# Altium footprint library PCB封装库.PcbLib: 109 footprints (part 7 of 7)
Each footprint in its own frame and in the unit in brackets; x right, y up, seen from the top. Pads: shape width x height; smd on the part's side, far side on the other; paste and mask are expansions set on the pad; w line width, h text height; cw(c..) or ccw(c..) is an arc to the next point about the centre after c.
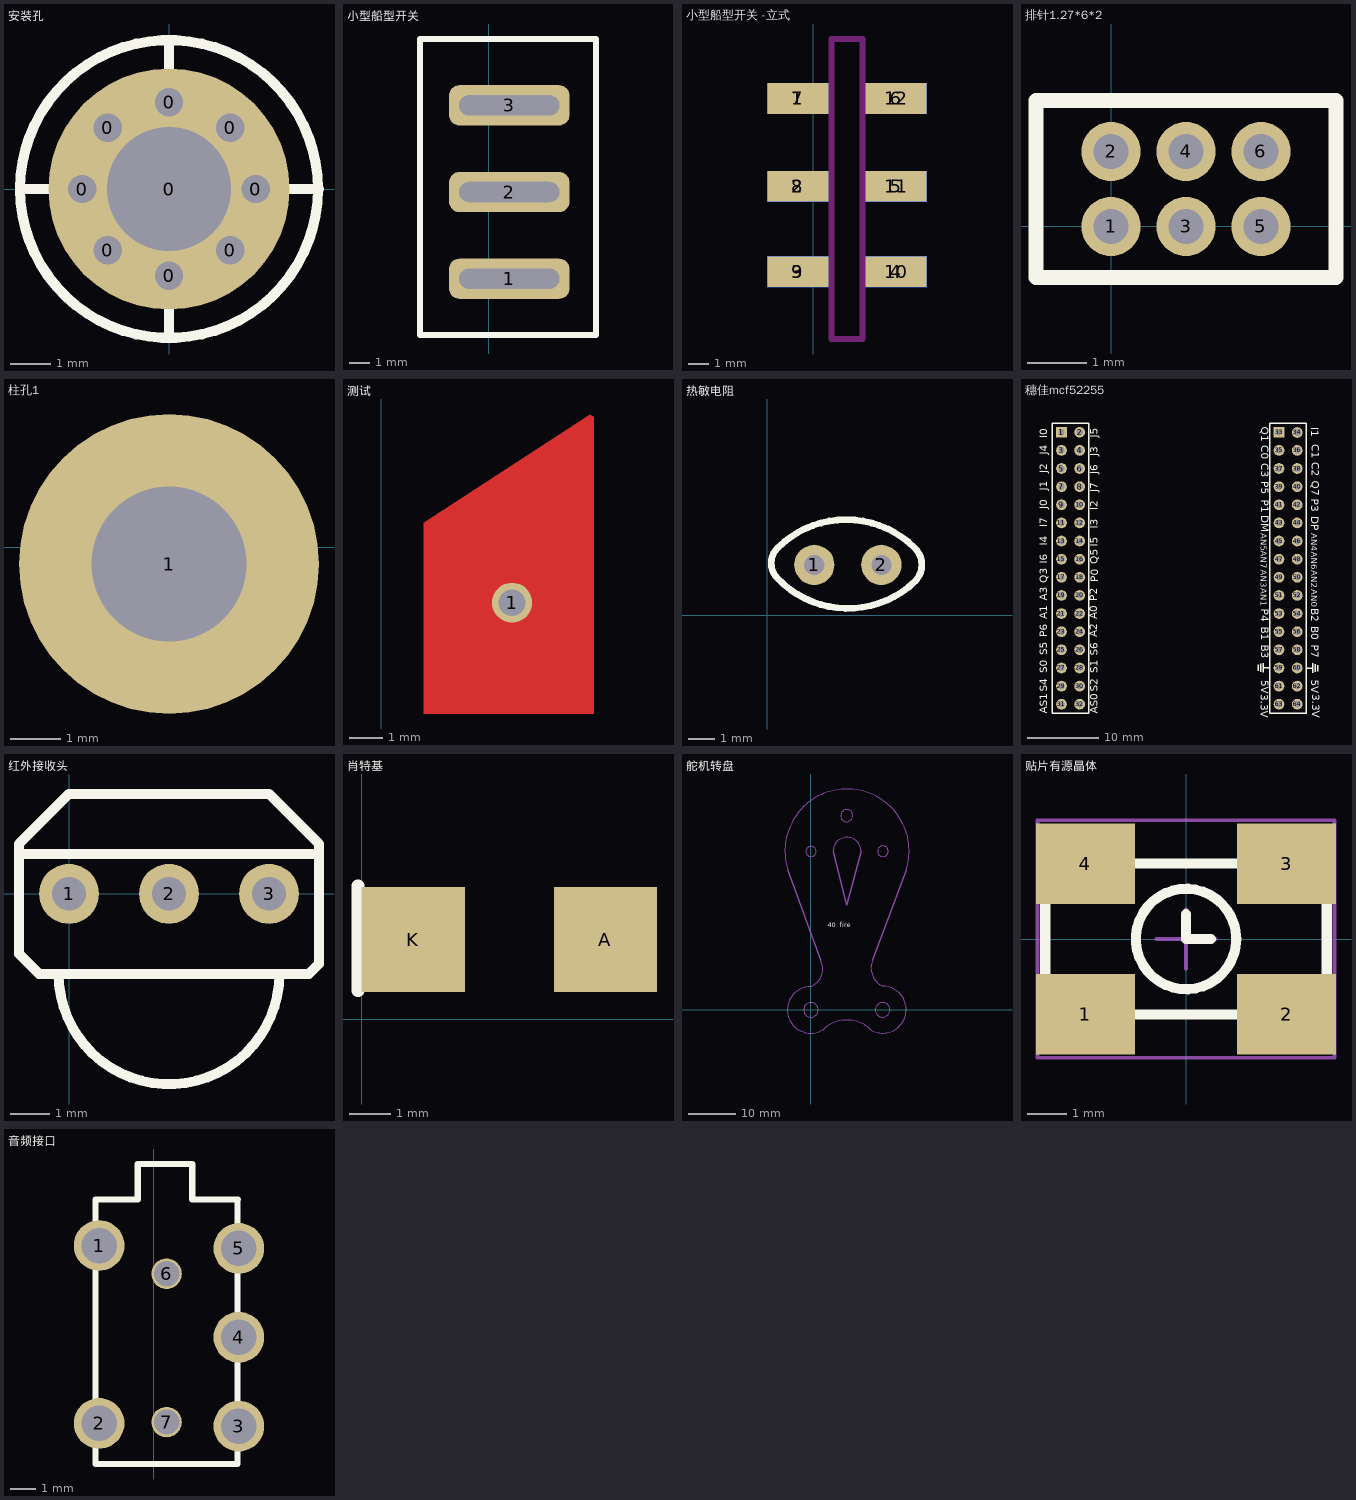
[diagram p6: the footprints below, top view; thin cyan lines are the x and y axes]

## 安装孔 [mm]
pads (9):
  round 1.2 hole 0.7: 0(-2.159,0) 0(-1.524,-1.524) 0(-1.524,1.524) 0(0,-2.159) 0(0,2.159) 0(1.524,-1.524) 0(1.524,1.524) 0(2.159,0)
  round 6 hole 3.1: 0(0,0)
Top Overlay:
  circle w0.254: c0,0 r3.709
  lines w0.254: 3.709,0 0,0 ; 3.735,0 0,0 ; 0,0 0,3.683 0,0 ; 0,0 0,-3.683 0,0 ; 0,0 -3.683,0 0,0
Bottom Overlay:
  circle w0.254: c0,0 r3.735
3D body: height 2.38, standoff -6, extent -2.825,-2.774 2.775,2.826

## 小型船型开关 [mm]
pads (3):
  rrect50% 6x2 hole 1 slot 5 at 0 deg: 1(1.016,4.064) 2(1.016,8.382) 3(1.016,12.7)
Top Overlay:
  lines w0.3: -3.429,1.27 5.334,1.27 5.334,16.002 -3.429,16.002 -3.429,1.27
3D body: height 4.5, standoff -14.51, extent -4.277,0.98 6.223,16.038

## 小型船型开关 -立式 [mm]
pads (12):
  rect 3x1.5 smd: 1(-0.762,12.954) 2(-0.762,8.636) 3(-0.762,4.445) 4(4.064,4.445) 5(4.064,8.636) 6(4.064,12.954)
  rect 3x1.5 smd far side: 7(-0.762,12.954) 8(-0.762,8.636) 9(-0.762,4.445) 10(4.064,4.445) 11(4.064,8.636) 12(4.064,12.954)
Keep-Out Layer:
  lines w0.3: 0.889,1.143 2.413,1.143 2.413,15.875 0.889,15.875 0.889,1.143
3D body: height 4.5, standoff -14.51, extent -4.277,0.98 6.223,16.038

## 排针1.27*6*2 [mm]
pads (6):
  round 1 hole 0.6: 1(0,0) 2(0,1.27) 3(1.27,0) 4(1.27,1.27) 5(2.54,0) 6(2.54,1.27)
Top Overlay:
  lines w0.254: -1.27,-0.864 -1.27,2.134 3.81,2.134 3.81,-0.864 -1.27,-0.864

## 柱孔1 [mm]
pads (1):
  round 6 hole 3.1: 1(6.655,-0.33)
3D body: height 2.38, standoff -6, extent 3.855,-3.13 9.455,2.47

## 测试 [mm]
pads (1):
  round 1.2 hole 0.8: 1(3.912,6.833)
Top Layer:
  region: 6.35,12.389 6.35,9.22 6.35,3.505 1.27,3.505 1.27,9.22 6.238,12.45
Top Paste:
  region: 6.335,12.411 6.335,9.242 6.335,3.527 1.255,3.527 1.255,9.242 6.223,12.471
Top Solder:
  region: 6.309,12.411 6.309,9.242 6.309,3.527 1.229,3.527 1.229,9.242 6.198,12.471

## 热敏电阻 [mil]
pads (2):
  round 60 hole 30: 1(70,75) 2(170,75)
Top Overlay:
  lines w10: 15,55 ccw(c120,155) 220,50 ccw(c195,75) 220,100 ccw(c117.5,-2.5) 15,100 ccw(c37.5,77.5) 15,55
3D body: height 1283.15, standoff -206.85, extent 29,0 211,154

## 穗佳mcf52255 [mm]
pads (64):
  rect 1.5x1.5 hole 0.9: 1(6.51,41.835) 33(36.99,41.835)
  round 1.5 hole 0.9: 2(9.05,41.835) 3(6.51,39.295) 4(9.05,39.295) 5(6.51,36.755) 6(9.05,36.755) 7(6.51,34.215) 8(9.05,34.215) 9(6.51,31.675) 10(9.05,31.675) 11(6.51,29.135) 12(9.05,29.135) 13(6.51,26.595) 14(9.05,26.595) 15(6.51,24.055) 16(9.05,24.055) 17(6.51,21.515) 18(9.05,21.515) 19(6.51,18.975) 20(9.05,18.975) 21(6.51,16.435) 22(9.05,16.435) 23(6.51,13.895) 24(9.05,13.895) 25(6.51,11.355) 26(9.05,11.355) 27(6.51,8.815) 28(9.05,8.815) 29(6.51,6.275) 30(9.05,6.275) 31(6.51,3.735) 32(9.05,3.735) 35(36.99,39.295) 36(39.53,39.295) 37(36.99,36.755) 38(39.53,36.755) 39(36.99,34.215) 40(39.53,34.215) 41(36.99,31.675) 42(39.53,31.675) 43(36.99,29.135) 44(39.53,29.135) 45(36.99,26.595) 46(39.53,26.595) 47(36.99,24.055) 48(39.53,24.055) 49(36.99,21.515) 50(39.53,21.515) 51(36.99,18.975) 52(39.53,18.975) 53(36.99,16.435) 54(39.53,16.435) 55(36.99,13.895) 56(39.53,13.895) 57(36.99,11.355) 58(39.53,11.355) 59(36.99,8.815) 60(39.53,8.815) 61(36.99,6.275) 62(39.53,6.275) 63(36.99,3.735) 64(39.53,3.735)
  round 1.5 hole 1: 34(39.548,41.808)
Top Overlay:
  lines w0.2: 34.094,8.434 34.094,9.247 ; 34.45,8.307 34.45,9.374 ; 34.806,8.18 34.806,9.501 ; 34.806,8.84 35.669,8.84 ; 40.851,8.789 41.714,8.789 ; 41.714,8.129 41.714,9.45 ; 42.07,8.256 42.07,9.323 ; 42.426,8.383 42.426,9.196 ; 5.24,2.465 10.32,2.465 10.32,43.105 5.24,43.105 5.24,2.465 ; 35.72,2.465 40.8,2.465 40.8,43.105 35.72,43.105 35.72,2.465
  text "I2" at 11.946,30.887 h1.8
  text "J6" at 11.946,35.967 h1.8
  text "J7" at 11.946,33.427 h1.8
  text "DP" at 41.156,30.049 h1.8
  text "DM" at 34.145,30.176 h1.8
  text "P4" at 34.145,17.121 h1.8
  text "B3" at 34.145,12.041 h1.8
  text "B2" at 41.181,17.171 h1.8
  text "B0" at 41.181,14.631 h1.8
  text "B1" at 34.145,14.581 h1.8
  text "C2" at 41.206,37.618 h1.8
  text "C3" at 34.12,37.466 h1.8
  text "C1" at 41.206,40.158 h1.8
  text "C0" at 34.12,40.006 h1.8
  text "J1" at 4.859,33.631 h1.8
  text "J0" at 4.859,31.04 h1.8
  text "I7" at 4.884,28.5 h1.8
  text "I1" at 41.13,42.521 h1.8
  text "I0" at 4.834,41.022 h1.8
  text "Q3" at 4.834,20.702 h1.8
  text "Q5" at 11.92,23.369 h1.8
  text "Q7" at 41.206,35.078 h1.8
  text "Q1" at 34.12,42.597 h1.8
  text "3.3V" at 34.094,5.106 h1.8
  text "3.3V" at 41.283,5.157 h1.8
  text "5V" at 34.12,7.113 h1.8
  text "5V" at 41.181,7.164 h1.8
  text "P0" at 11.989,20.853 h1.8
  text "P2" at 11.895,18.162 h1.8
  text "P6" at 4.859,13.133 h1.8
  text "P1" at 34.145,32.361 h1.8
  text "P3" at 41.181,32.513 h1.8
  text "P5" at 34.145,34.977 h1.8
  text "P7" at 41.156,12.091 h1.8
  text "AN5" at 34.094,27.712 h1.5
  text "AN7" at 34.094,25.249 h1.5
  text "AN2" at 41.181,22.505 h1.5
  text "AN0" at 41.181,19.864 h1.5
  text "AN1" at 34.069,19.991 h1.5
  text "AN3" at 34.094,22.607 h1.5
  text "AN6" at 41.181,25.122 h1.5
  text "AN4" at 41.181,27.662 h1.5
  text "J2" at 4.834,36.12 h1.8
  text "J3" at 11.946,38.507 h1.8
  text "J4" at 4.834,38.66 h1.8
  text "J5" at 11.946,41.047 h1.8
  text "S0" at 4.859,8.053 h1.8
  text "S1" at 11.92,8.053 h1.8
  text "S2" at 11.92,5.462 h1.8
  text "S4" at 4.859,5.513 h1.8
  text "S5" at 4.859,10.593 h1.8
  text "S6" at 11.92,10.542 h1.8
  text "AS1" at 4.834,2.363 h1.8
  text "AS0" at 11.946,2.363 h1.8
  text "A0" at 11.895,15.622 h1.8
  text "A2" at 11.895,13.082 h1.8
  text "A1" at 4.859,15.673 h1.8
  text "A3" at 4.859,18.213 h1.8
  text "I3" at 11.946,28.347 h1.8
  text "I5" at 11.946,25.807 h1.8
  text "I4" at 4.884,25.96 h1.8
  text "I6" at 4.884,23.42 h1.8
3D body: height 5, standoff -3.13, extent 38.303,2.388 41.351,15.088
3D body: height 5, standoff -3.13, extent 35.255,2.388 38.303,15.088
3D body: height 5, standoff -3.13, extent 38.278,5.156 41.326,17.856
3D body: height 5, standoff -3.13, extent 35.281,5.105 38.329,17.805
3D body: height 5, standoff -3.13, extent 38.278,17.805 41.326,30.505
3D body: height 5, standoff -3.13, extent 35.281,17.78 38.329,30.48
3D body: height 5, standoff -3.13, extent 38.252,30.48 41.3,43.18
3D body: height 5, standoff -3.13, extent 35.204,30.48 38.252,43.18
3D body: height 5, standoff -3.13, extent 7.95,2.489 10.998,15.189
3D body: height 5, standoff -3.13, extent 5.029,2.489 8.077,15.189
3D body: height 5, standoff -3.13, extent 8.052,5.105 11.1,17.805
3D body: height 5, standoff -3.13, extent 5.004,5.105 8.052,17.805
3D body: height 5, standoff -3.13, extent 8.052,17.755 11.1,30.455
3D body: height 5, standoff -3.13, extent 5.004,17.729 8.052,30.429
3D body: height 5, standoff -3.13, extent 8.052,30.404 11.1,43.104
3D body: height 5, standoff -3.13, extent 5.004,30.404 8.052,43.104

## 红外接收头 [mil]
pads (3):
  round 60 hole 33.94: 1(0,0) 2(100,0) 3(200,0)
Top Overlay:
  lines w10: -10.45,-80 ccw(c100,-80) 210.45,-80 ; 250,30 250,50 200,100 0,100 -50,50 -50,40 ; -50,40 -50,-60 -30,-80 240,-80 250,-70 250,40 -50,40
3D body: height 417.42, standoff -118.11, extent -30.59,-16.22 245,456.22

## 肖特基 [mm]
pads (2):
  rect 2.5x2.54 smd: A(5.899,1.926) K(1.254,1.926)
Top Overlay:
  lines w0.305: -0.085,0.69 -0.085,3.23
3D body: height 1, standoff -1.4, extent 0.956,0.61 6.156,3.21

## 舵机转盘 [mm]
Top Overlay:
  text "40  fire" at 3.556,17.297 h1
Mechanical 1:
  circle w0.254: c0,0 r1.524
  circle w0.254: c15.011,0 r1.524
  circle w0.254: c0.025,33.172 r1.068
  circle w0.254: c15.062,33.223 r1.118
  lines w0.254: -4.822,29.3 cw(c7.569,33.249) 19.925,29.191 ; 2.083,10.389 cw(c-1.657,8.636) 0.095,4.896 ccw(c-0.025,0) 2.454,-4.223 cw(c7.54,-9.348) 12.665,-4.261 ccw(c15.037,0.051) 15.062,4.972 cw(c16.742,8.785) 12.929,10.465 ; 4.649,33.074 cw(c7.569,33.198) 10.492,33.223 ; 8.763,40.665 cw(c7.493,40.691) 8.763,40.691
  lines w0.3: -4.822,29.3 2.083,10.389 ; 4.649,33.074 7.493,21.869 10.492,33.223 ; 12.954,10.49 19.925,29.191

## 贴片有源晶体 [mm]
pads (4):
  rect 2.5x2.032 smd: 1(-2.54,-1.905) 2(2.54,-1.905) 3(2.54,1.905) 4(-2.54,1.905)
Top Overlay:
  circle w0.254: c0,0 r1.27
  lines w0.254: -3.556,-1.905 -3.556,1.905 ; -1.27,-1.905 1.27,-1.905 ; -1.27,1.905 1.27,1.905 ; 0,0.635 0,0 0.635,0 ; 3.556,-1.905 3.556,1.905
Mechanical 15:
  lines w0.1: -0.75,0 0.75,0 ; 0,-0.75 0,0.75 ; -3.75,-3 3.75,-3 3.75,3 -3.75,3 -3.75,-3
3D body: height 1.6, standoff 0, extent -3.492,-2.5 3.508,2.5

## 音频接口 [mm]
pads (7):
  round 2 hole 1.4: 1(-2.146,9.616) 2(-2.146,2.616) 3(3.354,2.505) 4(3.354,6.005) 5(3.354,9.505)
  round 1.2 hole 1: 6(0.508,8.509) 7(0.508,2.667)
Top Overlay:
  lines w0.245: -2.286,11.43 -2.286,1.016 -0.924,1.016 1.586,1.016 2.076,1.016 2.076,1.015 3.298,1.015 3.298,11.393
  lines w0.254: -2.286,11.43 -0.635,11.43 -0.635,12.827 1.524,12.827 1.524,11.43 1.778,11.43 2.286,11.43 3.302,11.43
3D body: height -0.25, standoff -4.75, extent -4.318,-0.519 5.582,13.981